# Altium footprint library POT_TH.PcbLib: 65 footprints (part 2 of 5)
Each footprint in its own frame and in the unit in brackets; x right, y up, seen from the top. Pads: shape width x height; smd on the part's side, far side on the other; paste and mask are expansions set on the pad; w line width, h text height; cw(c..) or ccw(c..) is an arc to the next point about the centre after c.
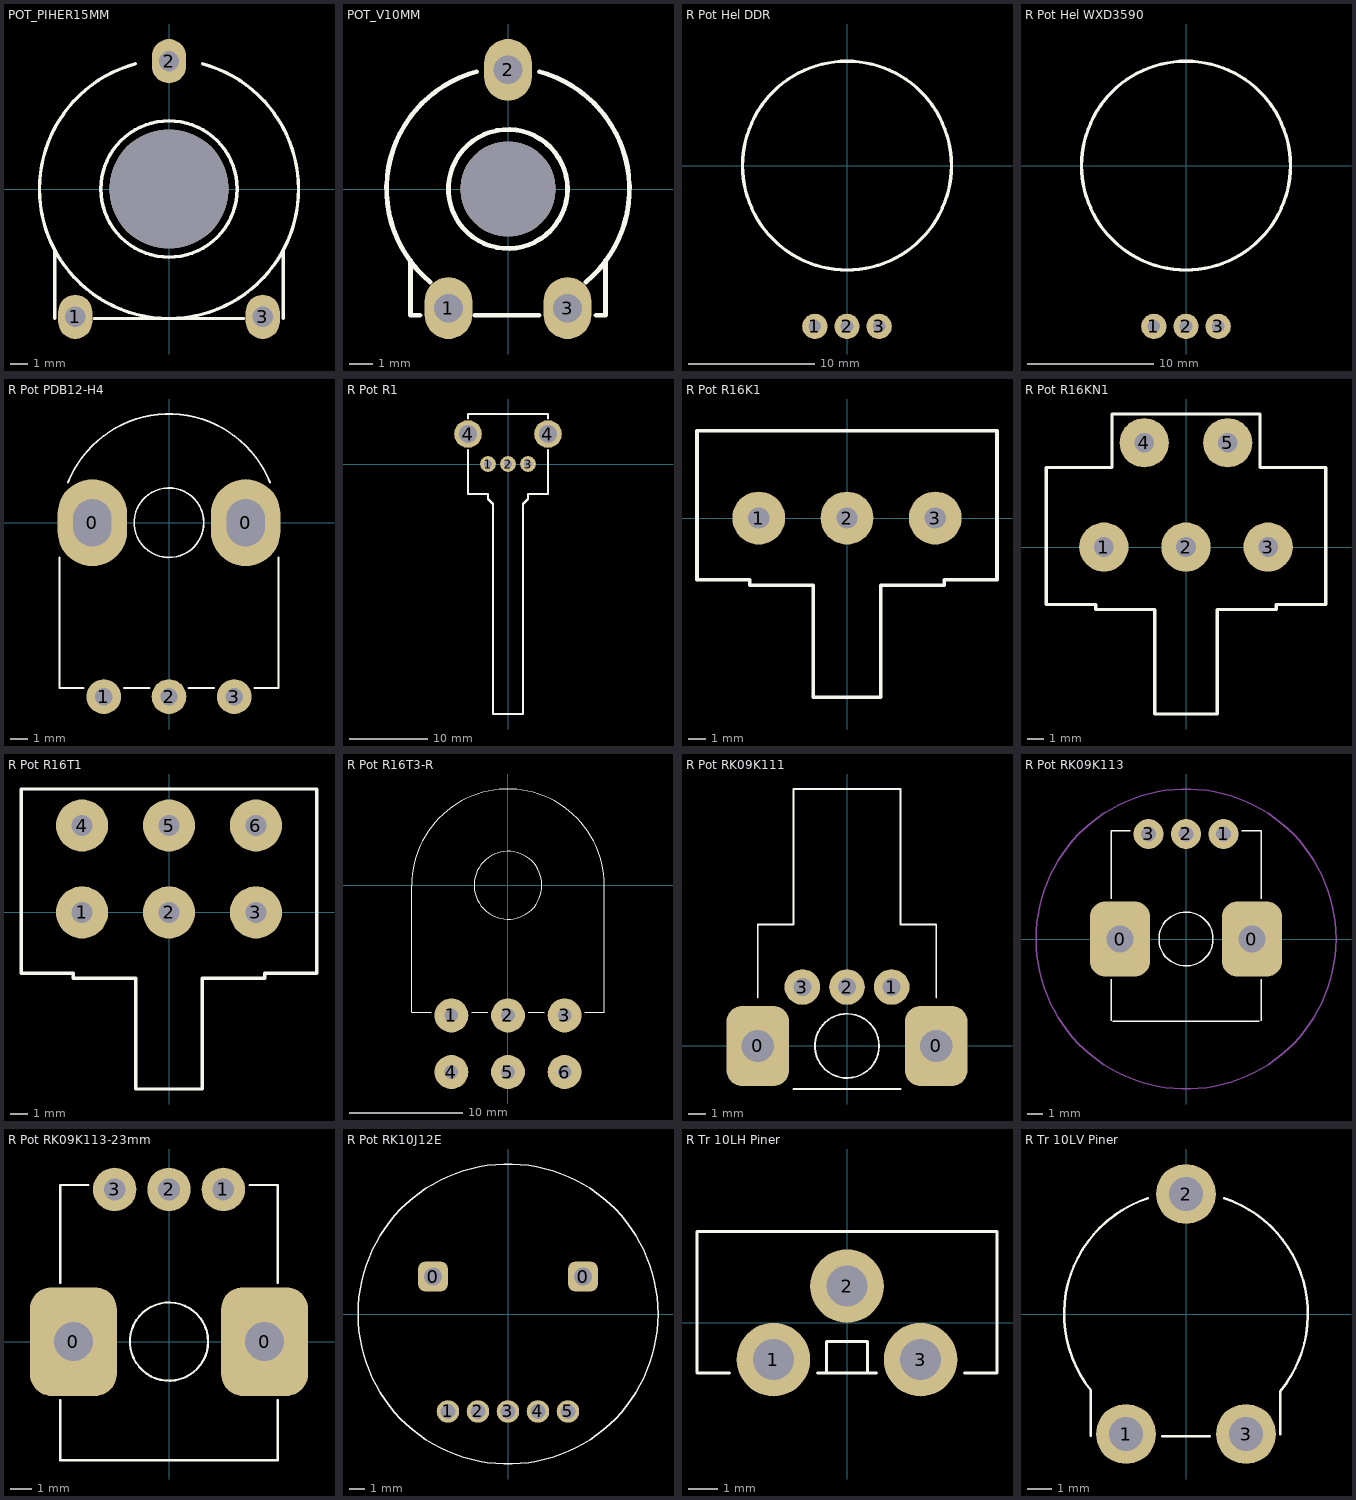
[diagram p1: the footprints below, top view; thin cyan lines are the x and y axes]

## POT_PIHER15MM [mm] "POT, TRIM, PIHER PT-15 15mm"
pads (4):
  oval 2x2.6 hole 1.2: 1(-5.5,-7.5) 2(0,7.5) 3(5.5,-7.5)
  round 7 hole 7 unplated mask+0.1: ""(0,0)
Top Overlay:
  circle w0.2: c0,0 r4
  lines w0.2: -6.7,-7.6 -6.7,-3.6 ; -4.4,-7.6 4.4,-7.6 ; -1.967,7.341 ccw(c0,0) -7.6,0 ccw(c0,0) 7.6,0 ccw(c0,0) 1.967,7.341 ; 6.7,-7.6 6.7,-3.6
3D body "Trimmer_Piher_PT-15.step": height 6.97, standoff -3.93, extent -7.5,-7.7 7.5,7.7

## POT_V10MM [mm] "POT, TRIM, V-10 10mm"
pads (4):
  oval 2x2.6 hole 1.2: 1(-2.5,-5) 2(0,5) 3(2.5,-5)
  round 4 hole 4 unplated mask+0.1: ""(0,0)
Top Overlay:
  circle w0.2: c0,0 r2.5
  lines w0.2: -4.1,-3 -4.1,-5.3 -3.7,-5.3 ; -3.278,-3.907 cw(c0,0) -1.32,4.926 ; -1.4,-5.3 1.3,-5.3 ; 1.32,4.926 cw(c0,0) 3.278,-3.907 ; 3.7,-5.3 4.1,-5.3 4.1,-3
3D body "User Library-Trimpot V10.step": height 5.9, standoff -3.4, extent -5.15,-5.207 5.15,5.093

## R Pot Hel DDR [mm]
pads (3):
  round 2 hole 1: 1(-2.54,-12.7) 2(0,-12.7) 3(2.54,-12.7)
Top Overlay:
  circle w0.254: c0,0 r8.25
Bottom Overlay:
  circle w0.254: c0,0 r10
3D body "Гаика M10x2,5.SLDPRT": height 4.7, standoff 2, extent -8.083,-7 8.083,7
3D body "Шаиба Ф10.SLDPRT": height 1.5, standoff 0, extent -8,-8 8,8
3D body "Pot-DDR Hel.STEP": height 46, standoff -18.5, extent -10.5,-10.5 10.5,10.5

## R Pot Hel WXD3590 [mm]
pads (3):
  round 2 hole 1: 1(-2.54,-12.7) 2(0,-12.7) 3(2.54,-12.7)
Top Overlay:
  circle w0.254: c0,0 r8.25
Bottom Overlay:
  circle w0.254: c0,0 r10
3D body "Pot Wire 10 turns WXD3590.STEP": height 20, standoff -20, extent -11.25,-11.25 11.25,15.491

## R Pot PDB12-H4 [mm]
pads (5):
  oval 4x5 hole 2.2 slot 2.7 at 90 deg: 0(-4.407,0) 0(4.407,0)
  round 2 hole 1: 1(-3.75,-10) 2(0,-10) 3(3.75,-10)
Top Overlay:
  circle w0.1: c0,0 r2
  lines w0.1: -6.3,-2 -6.3,-9.5 -4.9,-9.5 ; -5.81,2.304 cw(c0,0) 5.81,2.304 ; -2.6,-9.5 -1.1,-9.5 ; 1.1,-9.5 2.6,-9.5 ; 4.9,-9.5 6.3,-9.5 6.3,-2

## R Pot R1 [mm]
pads (5):
  round 2 hole 1: 1(-2.54,0) 2(0,0) 3(2.54,0)
  round 3.5 hole 2.235: 4(-5.08,3.81) 4(5.08,3.81)
Top Overlay:
  lines w0.254: -5.1,1.8 -5.1,-3.8 -2.54,-3.8 -2.54,-4.445 -1.905,-5.08 -1.905,-31.75 1.905,-31.75 1.905,-5.08 2.54,-4.445 2.54,-3.8 5.1,-3.8 5.1,1.8 ; -5.1,5.8 -5.1,6.35 5.1,6.35 5.1,5.8

## R Pot R16K1 [mm]
pads (3):
  round 3 hole 1.2: 1(-5,0) 2(0,0) 3(5,0)
Top Overlay:
  lines w0.2: 1.905,-3.81 1.905,-10.16 -1.905,-10.16 -1.905,-3.8 -5.5,-3.8 -5.5,-3.5 -8.5,-3.5 -8.5,4.95 8.5,4.95 8.5,-3.5 5.5,-3.5 5.5,-3.8 1.905,-3.8
3D body "Pot R16K1 Mono.STEP": height 20.07, standoff -4.57, extent -7.874,-20.605 7.874,4.953

## R Pot R16KN1 [mm]
pads (5):
  round 3 hole 1.2: 1(-5,0) 2(0,0) 3(5,0) 4(-2.54,6.35) 5(2.54,6.35)
Top Overlay:
  lines w0.2: 1.905,-3.81 1.905,-10.16 -1.905,-10.16 -1.905,-3.8 -5.5,-3.8 -5.5,-3.5 -8.5,-3.5 -8.5,4.85 -4.5,4.85 -4.5,8.1 4.5,8.1 4.5,4.85 8.5,4.85 8.5,-3.5 5.5,-3.5 5.5,-3.8 1.905,-3.8
3D body "Pot R16K1 Mono KL.STEP": height 20.07, standoff -4.57, extent -7.874,-20.732 7.874,4.826

## R Pot R16T1 [mm]
pads (6):
  round 3 hole 1.2: 1(-5,0) 2(0,0) 3(5,0) 4(-5,5) 5(0,5) 6(5,5)
Top Overlay:
  lines w0.2: 1.905,-3.81 1.905,-10.16 -1.905,-10.16 -1.905,-3.8 -5.5,-3.8 -5.5,-3.5 -8.5,-3.5 -8.5,7.1 8.5,7.1 8.5,-3.5 5.5,-3.5 5.5,-3.8 1.905,-3.8
3D body "Pot R16T1.STEP": height 21.2, standoff -3.3, extent -8.5,-33.35 8.5,7.5

## R Pot R16T3-R [mm]
pads (6):
  round 3 hole 1.2: 1(-5,-11.5) 2(0,-11.5) 3(5,-11.5) 4(-5,-16.5) 5(0,-16.5) 6(5,-16.5)
Top Overlay:
  circle w0.1: c0,0 r3
  lines w0.1: -6.8,-11.2 -8.5,-11.2 -8.5,0 cw(c0,0) 8.5,0 8.5,-11.2 6.8,-11.2 ; -3.2,-11.2 -1.8,-11.2 ; 1.8,-11.2 3.2,-11.2
3D body "Pot R16T3-R Stereo.STEP": height 25, standoff -3.96, extent -8.5,-16.5 8.5,8.5

## R Pot RK09K111 [mm]
pads (5):
  rrect50% 3.5x4.5 hole 1.8 square: 0(-5,0) 0(5,0)
  round 2 hole 1: 1(2.5,3.3) 2(0,3.3) 3(-2.5,3.3)
Top Overlay:
  circle w0.1: c0,0 r1.8
  lines w0.1: -5,2.7 -5,6.8 -2.993,6.8 -2.993,14.4 3,14.4 3,6.8 5,6.8 5,2.7 ; -3,-2.415 3,-2.415
3D body "Pot RK09K111-15.STEP": height 12.31, standoff -3.17, extent -5.726,-1.9 5.726,14.4

## R Pot RK09K113 [mm]
pads (5):
  rrect50% 4x5 hole 1.8 square: 0(-4.4,0) 0(4.4,0)
  round 2 hole 1: 1(2.5,7) 2(0,7) 3(-2.5,7)
Top Overlay:
  circle w0.1: c0,0 r1.8
  lines w0.1: -5,-5.461 -5,-2.7 ; -5,2.7 -5,7.2 -3.7,7.2 ; -4.9,-5.5 4.9,-5.5 ; 3.7,7.2 5,7.2 5,2.7 ; 5,-5.461 5,-2.7
Mechanical 1:
  circle w0.1: c0,0 r10
3D body "Pot RK09K113-20.STEP": height 19.9, standoff -3.8, extent -5.698,-5.5 5.698,7.15

## R Pot RK09K113-23mm [mm]
pads (5):
  rrect50% 4x5 hole 1.8 square: 0(-4.4,0) 0(4.4,0)
  round 2 hole 1: 1(2.5,7) 2(0,7) 3(-2.5,7)
Top Overlay:
  circle w0.1: c0,0 r1.8
  lines w0.1: -5,-2.7 -5,-5.461 5,-5.461 5,-2.7 ; -5,2.7 -5,7.2 -3.7,7.2 ; 3.7,7.2 5,7.2 5,2.7
3D body "Pot RK09K113-20.STEP": height 19.9, standoff -3.8, extent -5.698,-5.5 5.698,7.15

## R Pot RK10J12E [mm]
pads (7):
  rrect50% 2x2 hole 1.2 square: 0(-5,2.5) 0(5,2.5)
  round 1.5 hole 1: 1(-4,-6.5) 2(-2,-6.5) 3(0,-6.5) 4(2,-6.5) 5(4,-6.5)
Top Overlay:
  circle w0.1: c0,0 r10
3D body "Pot-CD.STEP": height 3.6, standoff -2.5, extent -10.249,-10.249 10.249,10.249

## R Tr 10LH Piner [mm]
pads (3):
  round 2.5 hole 1.4: 1(-2.5,-1.25) 2(0,1.25) 3(2.5,-1.25)
Top Overlay:
  lines w0.1: -4,-1.7 -5.1,-1.7 -5.1,3.1 5.1,3.1 5.1,-1.7 4,-1.7 ; -1,-1.7 1,-1.7 ; -0.7,-1.7 -0.7,-0.635 0.7,-0.635 0.7,-1.7
3D body "PT10LH.STEP": height 12.1, standoff -2.5, extent -5.15,-1.66 5.15,3.1

## R Tr 10LV Piner [mm]
pads (3):
  round 2.5 hole 1.4: 1(-2.5,-5) 2(0,5) 3(2.5,-5)
Top Overlay:
  lines w0.1: -3.967,-5.073 -3.967,-3.173 cw(c0,0) -1.591,4.824 ; -1,-5.1 1,-5.1 ; 1.591,4.824 cw(c0,0) 3.927,-3.222 3.927,-5.022
3D body "PT10LV.STEP": height 6.26, standoff -2.5, extent -5.15,-5.15 5.15,5.45